# Altium schematic symbol library jlcpcb_2025_04_ferrites_extended_0603.schlib: 833 symbols (part 2 of 4) (continued)
## CBW160808U310T
designator FB?  Impedance @ Frequency: 31Ω@100MHz
Ferrite, 31Ω@100MHz, ±25%, 80mΩ, 1A, SMD 0603; Manufacturer: FH(Guangdong Fenghua Advanced Tech); Manufacturer Part Number: CBW160808U310T; Package Size: 0603; JLCPCB Basic Part: No; JLCPCB Part Number: C361672; Supplier 1: LCSC; Category: Ferrite Beads; Supplier Part Number 1: C361672; Tolerance: ±25%; Rated Current: 1A; DC Resistance: 80mΩ; RoHS: Yes; ComponentLink1Description: Datasheet; ComponentLink1URL: https://wmsc.lcsc.com/wmsc/upload/file/pdf/v2/lcsc/2304140030_FH--Guangdong-Fenghua-Advanced-Tech-CBW160808U310T_C361672.pdf; ComponentLink2Description: JLCPCB Part URL; ComponentLink2URL: https://jlcpcb.com/partdetail/C361672; ComponentLink3Description: LCSC Part URL; ComponentLink3URL: https://lcsc.com/product-detail/Ferrite-Beads_FH-Guangdong-Fenghua-Advanced-Tech-FH-Guangdong-Fenghua-Advanced-Tech-CBW160808U310T_C361672.html
footprint FB-0603 (0603 (1608M) Ferrite)
pins: 1, 2

## CBW160808U330T
designator FB?  Impedance @ Frequency: 33Ω@100MHz
Ferrite, 33Ω@100MHz, ±25%, SMD 0603; Manufacturer: FH(Guangdong Fenghua Advanced Tech); Manufacturer Part Number: CBW160808U330T; Package Size: 0603; JLCPCB Basic Part: No; JLCPCB Part Number: C139180; Supplier 1: LCSC; Category: Ferrite Beads; Supplier Part Number 1: C139180; Tolerance: ±25%; RoHS: Yes; ComponentLink1Description: Datasheet; ComponentLink1URL: https://wmsc.lcsc.com/wmsc/upload/file/pdf/v2/lcsc/2008192032_FH--Guangdong-Fenghua-Advanced-Tech-CBW160808U330T_C139180.pdf; ComponentLink2Description: JLCPCB Part URL; ComponentLink2URL: https://jlcpcb.com/partdetail/C139180; ComponentLink3Description: LCSC Part URL; ComponentLink3URL: https://lcsc.com/product-detail/Ferrite-Beads_FH-Guangdong-Fenghua-Advanced-Tech-FH-Guangdong-Fenghua-Advanced-Tech-CBW160808U330T_C139180.html
pins: 1, 2

## CBW160808U331T
designator FB?  Impedance @ Frequency: 330Ω@100MHz
Ferrite, 330Ω@100MHz, ±25%, SMD 0603; Manufacturer: FH(Guangdong Fenghua Advanced Tech); Manufacturer Part Number: CBW160808U331T; Package Size: 0603; JLCPCB Basic Part: No; JLCPCB Part Number: C139181; Supplier 1: LCSC; Category: Ferrite Beads; Supplier Part Number 1: C139181; Tolerance: ±25%; RoHS: Yes; ComponentLink1Description: Datasheet; ComponentLink1URL: https://wmsc.lcsc.com/wmsc/upload/file/pdf/v2/lcsc/2304140030_FH--Guangdong-Fenghua-Advanced-Tech-CBW160808U331T_C139181.pdf; ComponentLink2Description: JLCPCB Part URL; ComponentLink2URL: https://jlcpcb.com/partdetail/C139181; ComponentLink3Description: LCSC Part URL; ComponentLink3URL: https://lcsc.com/product-detail/Ferrite-Beads_FH-Guangdong-Fenghua-Advanced-Tech-FH-Guangdong-Fenghua-Advanced-Tech-CBW160808U331T_C139181.html
pins: 1, 2

## CBW160808U391T
designator FB?  Impedance @ Frequency: 390Ω@100MHz
Ferrite, 390Ω@100MHz, ±25%, SMD 0603; Manufacturer: FH(Guangdong Fenghua Advanced Tech); Manufacturer Part Number: CBW160808U391T; Package Size: 0603; JLCPCB Basic Part: No; JLCPCB Part Number: C394472; Supplier 1: LCSC; Category: Ferrite Beads; Supplier Part Number 1: C394472; Tolerance: ±25%; RoHS: Yes; ComponentLink1Description: Datasheet; ComponentLink1URL: https://wmsc.lcsc.com/wmsc/upload/file/pdf/v2/lcsc/1912111437_FH--Guangdong-Fenghua-Advanced-Tech-CBW160808U391T_C394472.pdf; ComponentLink2Description: JLCPCB Part URL; ComponentLink2URL: https://jlcpcb.com/partdetail/C394472; ComponentLink3Description: LCSC Part URL; ComponentLink3URL: https://lcsc.com/product-detail/Ferrite-Beads_FH-Guangdong-Fenghua-Advanced-Tech-FH-Guangdong-Fenghua-Advanced-Tech-CBW160808U391T_C394472.html
pins: 1, 2

## CBW160808U401T
designator FB?  Impedance @ Frequency: 400Ω@100MHz
Ferrite, 400Ω@100MHz, ±25%, SMD 0603; Manufacturer: FH(Guangdong Fenghua Advanced Tech); Manufacturer Part Number: CBW160808U401T; Package Size: 0603; JLCPCB Basic Part: No; JLCPCB Part Number: C394473; Supplier 1: LCSC; Category: Ferrite Beads; Supplier Part Number 1: C394473; Tolerance: ±25%; RoHS: Yes; ComponentLink1Description: Datasheet; ComponentLink1URL: https://wmsc.lcsc.com/wmsc/upload/file/pdf/v2/lcsc/1912111437_FH--Guangdong-Fenghua-Advanced-Tech-CBW160808U401T_C394473.pdf; ComponentLink2Description: JLCPCB Part URL; ComponentLink2URL: https://jlcpcb.com/partdetail/C394473; ComponentLink3Description: LCSC Part URL; ComponentLink3URL: https://lcsc.com/product-detail/Ferrite-Beads_FH-Guangdong-Fenghua-Advanced-Tech-FH-Guangdong-Fenghua-Advanced-Tech-CBW160808U401T_C394473.html
pins: 1, 2

## CBW160808U470T
designator FB?  Impedance @ Frequency: 47Ω@100MHz
Ferrite, 47Ω@100MHz, ±25%, SMD 0603; Manufacturer: FH(Guangdong Fenghua Advanced Tech); Manufacturer Part Number: CBW160808U470T; Package Size: 0603; JLCPCB Basic Part: No; JLCPCB Part Number: C394474; Supplier 1: LCSC; Category: Ferrite Beads; Supplier Part Number 1: C394474; Tolerance: ±25%; RoHS: Yes; ComponentLink1Description: Datasheet; ComponentLink1URL: https://wmsc.lcsc.com/wmsc/upload/file/pdf/v2/lcsc/1912111437_FH--Guangdong-Fenghua-Advanced-Tech-CBW160808U470T_C394474.pdf; ComponentLink2Description: JLCPCB Part URL; ComponentLink2URL: https://jlcpcb.com/partdetail/C394474; ComponentLink3Description: LCSC Part URL; ComponentLink3URL: https://lcsc.com/product-detail/Ferrite-Beads_FH-Guangdong-Fenghua-Advanced-Tech-FH-Guangdong-Fenghua-Advanced-Tech-CBW160808U470T_C394474.html
pins: 1, 2

## CBW160808U471T
designator FB?  Impedance @ Frequency: 470Ω@100MHz
Ferrite, 470Ω@100MHz, ±25%, SMD 0603; Manufacturer: FH(Guangdong Fenghua Advanced Tech); Manufacturer Part Number: CBW160808U471T; Package Size: 0603; JLCPCB Basic Part: No; JLCPCB Part Number: C394475; Supplier 1: LCSC; Category: Ferrite Beads; Supplier Part Number 1: C394475; Tolerance: ±25%; RoHS: Yes; ComponentLink1Description: Datasheet; ComponentLink1URL: https://wmsc.lcsc.com/wmsc/upload/file/pdf/v2/lcsc/1912111437_FH--Guangdong-Fenghua-Advanced-Tech-CBW160808U471T_C394475.pdf; ComponentLink2Description: JLCPCB Part URL; ComponentLink2URL: https://jlcpcb.com/partdetail/C394475; ComponentLink3Description: LCSC Part URL; ComponentLink3URL: https://lcsc.com/product-detail/Ferrite-Beads_FH-Guangdong-Fenghua-Advanced-Tech-FH-Guangdong-Fenghua-Advanced-Tech-CBW160808U471T_C394475.html
pins: 1, 2

## CBW160808U500T
designator FB?  Impedance @ Frequency: 50Ω@100MHz
Ferrite, 50Ω@100MHz, ±25%, 120mΩ, 1A, SMD 0603; Manufacturer: FH(Guangdong Fenghua Advanced Tech); Manufacturer Part Number: CBW160808U500T; Package Size: 0603; JLCPCB Basic Part: No; JLCPCB Part Number: C394476; Supplier 1: LCSC; Category: Ferrite Beads; Supplier Part Number 1: C394476; Tolerance: ±25%; Rated Current: 1A; DC Resistance: 120mΩ; RoHS: Yes; ComponentLink1Description: Datasheet; ComponentLink1URL: https://wmsc.lcsc.com/wmsc/upload/file/pdf/v2/lcsc/2304140030_FH--Guangdong-Fenghua-Advanced-Tech-CBW160808U500T_C394476.pdf; ComponentLink2Description: JLCPCB Part URL; ComponentLink2URL: https://jlcpcb.com/partdetail/C394476; ComponentLink3Description: LCSC Part URL; ComponentLink3URL: https://lcsc.com/product-detail/Ferrite-Beads_FH-Guangdong-Fenghua-Advanced-Tech-FH-Guangdong-Fenghua-Advanced-Tech-CBW160808U500T_C394476.html
footprint FB-0603 (0603 (1608M) Ferrite)
pins: 1, 2

## CBW160808U600T
designator FB?  Impedance @ Frequency: 60Ω@100MHz
Ferrite, 60Ω@100MHz, ±25%, 120mΩ, 1A, SMD 0603; Manufacturer: FH(Guangdong Fenghua Advanced Tech); Manufacturer Part Number: CBW160808U600T; Package Size: 0603; JLCPCB Basic Part: No; JLCPCB Part Number: C139182; Supplier 1: LCSC; Category: Ferrite Beads; Supplier Part Number 1: C139182; Tolerance: ±25%; Rated Current: 1A; DC Resistance: 120mΩ; RoHS: Yes; ComponentLink1Description: Datasheet; ComponentLink1URL: https://wmsc.lcsc.com/wmsc/upload/file/pdf/v2/lcsc/2304140030_FH--Guangdong-Fenghua-Advanced-Tech-CBW160808U600T_C139182.pdf; ComponentLink2Description: JLCPCB Part URL; ComponentLink2URL: https://jlcpcb.com/partdetail/C139182; ComponentLink3Description: LCSC Part URL; ComponentLink3URL: https://lcsc.com/product-detail/Ferrite-Beads_FH-Guangdong-Fenghua-Advanced-Tech-FH-Guangdong-Fenghua-Advanced-Tech-CBW160808U600T_C139182.html
footprint FB-0603 (0603 (1608M) Ferrite)
pins: 1, 2

## CBW160808U601T
designator FB?  Impedance @ Frequency: 600Ω@100MHz
Ferrite, 600Ω@100MHz, ±25%, 400mΩ, 1A, SMD 0603; Manufacturer: FH(Guangdong Fenghua Advanced Tech); Manufacturer Part Number: CBW160808U601T; Package Size: 0603; JLCPCB Basic Part: No; JLCPCB Part Number: C139183; Supplier 1: LCSC; Category: Ferrite Beads; Supplier Part Number 1: C139183; Tolerance: ±25%; Rated Current: 1A; DC Resistance: 400mΩ; RoHS: Yes; ComponentLink1Description: Datasheet; ComponentLink1URL: https://wmsc.lcsc.com/wmsc/upload/file/pdf/v2/lcsc/2304140030_FH--Guangdong-Fenghua-Advanced-Tech-CBW160808U601T_C139183.pdf; ComponentLink2Description: JLCPCB Part URL; ComponentLink2URL: https://jlcpcb.com/partdetail/C139183; ComponentLink3Description: LCSC Part URL; ComponentLink3URL: https://lcsc.com/product-detail/Ferrite-Beads_FH-Guangdong-Fenghua-Advanced-Tech-FH-Guangdong-Fenghua-Advanced-Tech-CBW160808U601T_C139183.html
footprint FB-0603 (0603 (1608M) Ferrite)
pins: 1, 2

## CBW160808U700T
designator FB?  Impedance @ Frequency: 70Ω@100MHz
Ferrite, 70Ω@100MHz, ±25%, 150mΩ, 1A, SMD 0603; Manufacturer: FH(Guangdong Fenghua Advanced Tech); Manufacturer Part Number: CBW160808U700T; Package Size: 0603; JLCPCB Basic Part: No; JLCPCB Part Number: C394477; Supplier 1: LCSC; Category: Ferrite Beads; Supplier Part Number 1: C394477; Tolerance: ±25%; Rated Current: 1A; DC Resistance: 150mΩ; RoHS: Yes; ComponentLink1Description: Datasheet; ComponentLink1URL: https://wmsc.lcsc.com/wmsc/upload/file/pdf/v2/lcsc/2304140030_FH--Guangdong-Fenghua-Advanced-Tech-CBW160808U700T_C394477.pdf; ComponentLink2Description: JLCPCB Part URL; ComponentLink2URL: https://jlcpcb.com/partdetail/C394477; ComponentLink3Description: LCSC Part URL; ComponentLink3URL: https://lcsc.com/product-detail/Ferrite-Beads_FH-Guangdong-Fenghua-Advanced-Tech-FH-Guangdong-Fenghua-Advanced-Tech-CBW160808U700T_C394477.html
footprint FB-0603 (0603 (1608M) Ferrite)
pins: 1, 2

## CBW160808U750T
designator FB?  Impedance @ Frequency: 75Ω@100MHz
Ferrite, 75Ω@100MHz, ±25%, SMD 0603; Manufacturer: FH(Guangdong Fenghua Advanced Tech); Manufacturer Part Number: CBW160808U750T; Package Size: 0603; JLCPCB Basic Part: No; JLCPCB Part Number: C394478; Supplier 1: LCSC; Category: Ferrite Beads; Supplier Part Number 1: C394478; Tolerance: ±25%; RoHS: Yes; ComponentLink1Description: Datasheet; ComponentLink1URL: https://wmsc.lcsc.com/wmsc/upload/file/pdf/v2/lcsc/1912111437_FH--Guangdong-Fenghua-Advanced-Tech-CBW160808U750T_C394478.pdf; ComponentLink2Description: JLCPCB Part URL; ComponentLink2URL: https://jlcpcb.com/partdetail/C394478; ComponentLink3Description: LCSC Part URL; ComponentLink3URL: https://lcsc.com/product-detail/Ferrite-Beads_FH-Guangdong-Fenghua-Advanced-Tech-FH-Guangdong-Fenghua-Advanced-Tech-CBW160808U750T_C394478.html
pins: 1, 2

## CBW160808U751T
designator FB?  Impedance @ Frequency: 750Ω@100MHz
Ferrite, 750Ω@100MHz, ±25%, SMD 0603; Manufacturer: FH(Guangdong Fenghua Advanced Tech); Manufacturer Part Number: CBW160808U751T; Package Size: 0603; JLCPCB Basic Part: No; JLCPCB Part Number: C394479; Supplier 1: LCSC; Category: Ferrite Beads; Supplier Part Number 1: C394479; Tolerance: ±25%; RoHS: Yes; ComponentLink1Description: Datasheet; ComponentLink1URL: https://wmsc.lcsc.com/wmsc/upload/file/pdf/v2/lcsc/1912111437_FH--Guangdong-Fenghua-Advanced-Tech-CBW160808U751T_C394479.pdf; ComponentLink2Description: JLCPCB Part URL; ComponentLink2URL: https://jlcpcb.com/partdetail/C394479; ComponentLink3Description: LCSC Part URL; ComponentLink3URL: https://lcsc.com/product-detail/Ferrite-Beads_FH-Guangdong-Fenghua-Advanced-Tech-FH-Guangdong-Fenghua-Advanced-Tech-CBW160808U751T_C394479.html
pins: 1, 2

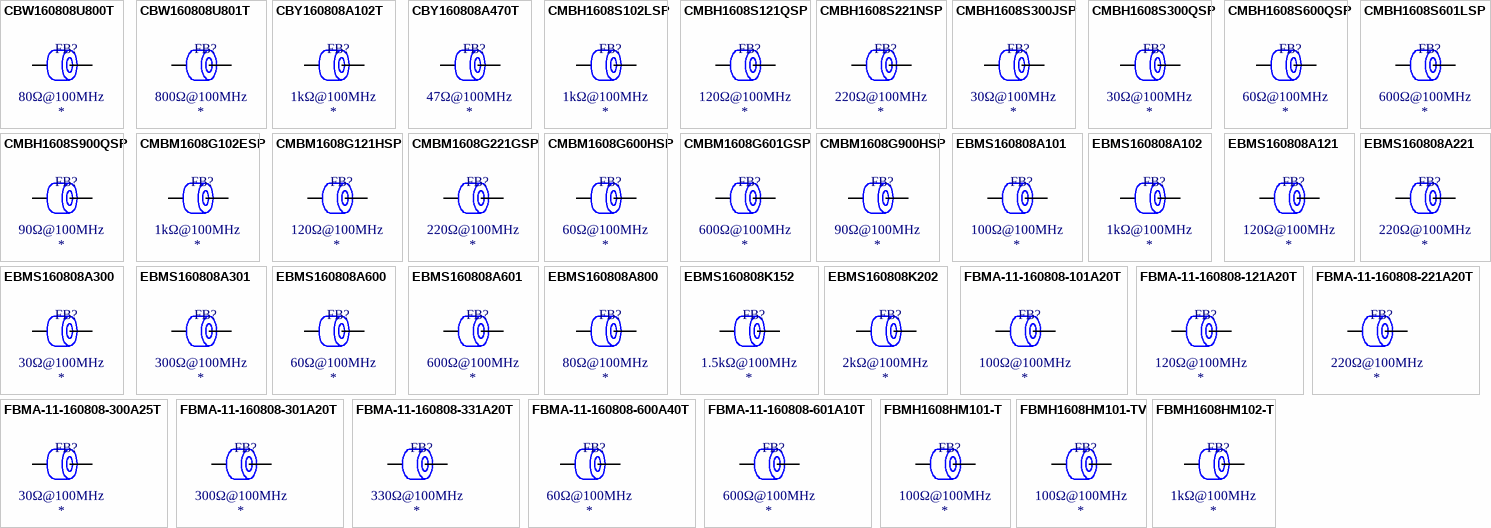
[diagram p8: symbols CBW160808U800T to FBMH1608HM102-T]

## CBW160808U800T
designator FB?  Impedance @ Frequency: 80Ω@100MHz
Ferrite, 80Ω@100MHz, ±25%, 200mΩ, 1A, SMD 0603; Manufacturer: FH(Guangdong Fenghua Advanced Tech); Manufacturer Part Number: CBW160808U800T; Package Size: 0603; JLCPCB Basic Part: No; JLCPCB Part Number: C268312; Supplier 1: LCSC; Category: Ferrite Beads; Supplier Part Number 1: C268312; Tolerance: ±25%; Rated Current: 1A; DC Resistance: 200mΩ; RoHS: Yes; ComponentLink1Description: Datasheet; ComponentLink1URL: https://wmsc.lcsc.com/wmsc/upload/file/pdf/v2/lcsc/2304140030_FH--Guangdong-Fenghua-Advanced-Tech-CBW160808U800T_C268312.pdf; ComponentLink2Description: JLCPCB Part URL; ComponentLink2URL: https://jlcpcb.com/partdetail/C268312; ComponentLink3Description: LCSC Part URL; ComponentLink3URL: https://lcsc.com/product-detail/Ferrite-Beads_FH-Guangdong-Fenghua-Advanced-Tech-FH-Guangdong-Fenghua-Advanced-Tech-CBW160808U800T_C268312.html
footprint FB-0603 (0603 (1608M) Ferrite)
pins: 1, 2

## CBW160808U801T
designator FB?  Impedance @ Frequency: 800Ω@100MHz
Ferrite, 800Ω@100MHz, ±25%, 550mΩ, 500mA, SMD 0603; Manufacturer: FH(Guangdong Fenghua Advanced Tech); Manufacturer Part Number: CBW160808U801T; Package Size: 0603; JLCPCB Basic Part: No; JLCPCB Part Number: C361676; Supplier 1: LCSC; Category: Ferrite Beads; Supplier Part Number 1: C361676; Tolerance: ±25%; Rated Current: 500mA; DC Resistance: 550mΩ; RoHS: Yes; ComponentLink1Description: Datasheet; ComponentLink1URL: https://wmsc.lcsc.com/wmsc/upload/file/pdf/v2/lcsc/1912111437_FH--Guangdong-Fenghua-Advanced-Tech-CBW160808U801T_C361676.pdf; ComponentLink2Description: JLCPCB Part URL; ComponentLink2URL: https://jlcpcb.com/partdetail/C361676; ComponentLink3Description: LCSC Part URL; ComponentLink3URL: https://lcsc.com/product-detail/Ferrite-Beads_FH-Guangdong-Fenghua-Advanced-Tech-FH-Guangdong-Fenghua-Advanced-Tech-CBW160808U801T_C361676.html
footprint FB-0603 (0603 (1608M) Ferrite)
pins: 1, 2

## CBY160808A102T
designator FB?  Impedance @ Frequency: 1kΩ@100MHz
Ferrite, 1kΩ@100MHz, ±25%, 900mΩ, 100mA, SMD 0603; Manufacturer: FH(Guangdong Fenghua Advanced Tech); Manufacturer Part Number: CBY160808A102T; Package Size: 0603; JLCPCB Basic Part: No; JLCPCB Part Number: C1322416; Supplier 1: LCSC; Category: Ferrite Beads; Supplier Part Number 1: C1322416; Tolerance: ±25%; Rated Current: 100mA; DC Resistance: 900mΩ; RoHS: Yes; ComponentLink1Description: Datasheet; ComponentLink1URL: https://wmsc.lcsc.com/wmsc/upload/file/pdf/v2/lcsc/2012181943_FH--Guangdong-Fenghua-Advanced-Tech-CBY160808A102T_C1322416.pdf; ComponentLink2Description: JLCPCB Part URL; ComponentLink2URL: https://jlcpcb.com/partdetail/C1322416; ComponentLink3Description: LCSC Part URL; ComponentLink3URL: https://lcsc.com/product-detail/Ferrite-Beads_FH-Guangdong-Fenghua-Advanced-Tech-FH-Guangdong-Fenghua-Advanced-Tech-CBY160808A102T_C1322416.html
footprint FB-0603 (0603 (1608M) Ferrite)
pins: 1, 2

## CBY160808A470T
designator FB?  Impedance @ Frequency: 47Ω@100MHz
Ferrite, 47Ω@100MHz, ±25%, SMD 0603; Manufacturer: FH(Guangdong Fenghua Advanced Tech); Manufacturer Part Number: CBY160808A470T; Package Size: 0603; JLCPCB Basic Part: No; JLCPCB Part Number: C1322417; Supplier 1: LCSC; Category: Ferrite Beads; Supplier Part Number 1: C1322417; Tolerance: ±25%; RoHS: Yes; ComponentLink1Description: Datasheet; ComponentLink1URL: https://wmsc.lcsc.com/wmsc/upload/file/pdf/v2/lcsc/2012182008_FH--Guangdong-Fenghua-Advanced-Tech-CBY160808A470T_C1322417.pdf; ComponentLink2Description: JLCPCB Part URL; ComponentLink2URL: https://jlcpcb.com/partdetail/C1322417; ComponentLink3Description: LCSC Part URL; ComponentLink3URL: https://lcsc.com/product-detail/Ferrite-Beads_FH-Guangdong-Fenghua-Advanced-Tech-FH-Guangdong-Fenghua-Advanced-Tech-CBY160808A470T_C1322417.html
pins: 1, 2

## CMBH1608S102LSP
designator FB?  Impedance @ Frequency: 1kΩ@100MHz
Ferrite, 1kΩ@100MHz, ±25%, 300mΩ, 1A, SMD 0603; Manufacturer: Cybermax; Manufacturer Part Number: CMBH1608S102LSP; Package Size: 0603; JLCPCB Basic Part: No; JLCPCB Part Number: C405004; Supplier 1: LCSC; Category: Ferrite Beads; Supplier Part Number 1: C405004; Tolerance: ±25%; Rated Current: 1A; DC Resistance: 300mΩ; RoHS: Yes; ComponentLink1Description: Datasheet; ComponentLink1URL: https://wmsc.lcsc.com/wmsc/upload/file/pdf/v2/lcsc/1912111437_Cybermax-CMBH1608S102LSP_C405004.pdf; ComponentLink2Description: JLCPCB Part URL; ComponentLink2URL: https://jlcpcb.com/partdetail/C405004; ComponentLink3Description: LCSC Part URL; ComponentLink3URL: https://lcsc.com/product-detail/Ferrite-Beads_Cybermax-Cybermax-CMBH1608S102LSP_C405004.html
footprint FB-0603 (0603 (1608M) Ferrite)
pins: 1, 2

## CMBH1608S121QSP
designator FB?  Impedance @ Frequency: 120Ω@100MHz
Ferrite, 120Ω@100MHz, ±25%, 70mΩ, 3A, SMD 0603; Manufacturer: Cybermax; Manufacturer Part Number: CMBH1608S121QSP; Package Size: 0603; JLCPCB Basic Part: No; JLCPCB Part Number: C405001; Supplier 1: LCSC; Category: Ferrite Beads; Supplier Part Number 1: C405001; Tolerance: ±25%; Rated Current: 3A; DC Resistance: 70mΩ; RoHS: Yes; ComponentLink1Description: Datasheet; ComponentLink1URL: https://wmsc.lcsc.com/wmsc/upload/file/pdf/v2/lcsc/2304140030_Cybermax-CMBH1608S121QSP_C405001.pdf; ComponentLink2Description: JLCPCB Part URL; ComponentLink2URL: https://jlcpcb.com/partdetail/C405001; ComponentLink3Description: LCSC Part URL; ComponentLink3URL: https://lcsc.com/product-detail/Ferrite-Beads_Cybermax-Cybermax-CMBH1608S121QSP_C405001.html
footprint FB-0603 (0603 (1608M) Ferrite)
pins: 1, 2

## CMBH1608S221NSP
designator FB?  Impedance @ Frequency: 220Ω@100MHz
Ferrite, 220Ω@100MHz, ±25%, 90mΩ, 2A, SMD 0603; Manufacturer: Cybermax; Manufacturer Part Number: CMBH1608S221NSP; Package Size: 0603; JLCPCB Basic Part: No; JLCPCB Part Number: C405002; Supplier 1: LCSC; Category: Ferrite Beads; Supplier Part Number 1: C405002; Tolerance: ±25%; Rated Current: 2A; DC Resistance: 90mΩ; RoHS: Yes; ComponentLink1Description: Datasheet; ComponentLink1URL: https://wmsc.lcsc.com/wmsc/upload/file/pdf/v2/lcsc/2304140030_Cybermax-CMBH1608S221NSP_C405002.pdf; ComponentLink2Description: JLCPCB Part URL; ComponentLink2URL: https://jlcpcb.com/partdetail/C405002; ComponentLink3Description: LCSC Part URL; ComponentLink3URL: https://lcsc.com/product-detail/Ferrite-Beads_Cybermax-Cybermax-CMBH1608S221NSP_C405002.html
footprint FB-0603 (0603 (1608M) Ferrite)
pins: 1, 2

## CMBH1608S300JSP
designator FB?  Impedance @ Frequency: 30Ω@100MHz
Ferrite, 30Ω@100MHz, ±25%, 800mA, SMD 0603; Manufacturer: Cybermax; Manufacturer Part Number: CMBH1608S300JSP; Package Size: 0603; JLCPCB Basic Part: No; JLCPCB Part Number: C404978; Supplier 1: LCSC; Category: Ferrite Beads; Supplier Part Number 1: C404978; Tolerance: ±25%; Rated Current: 800mA; RoHS: Yes; ComponentLink1Description: Datasheet; ComponentLink1URL: https://wmsc.lcsc.com/wmsc/upload/file/pdf/v2/lcsc/2304140030_Cybermax-CMBH1608S300JSP_C404978.pdf; ComponentLink2Description: JLCPCB Part URL; ComponentLink2URL: https://jlcpcb.com/partdetail/C404978; ComponentLink3Description: LCSC Part URL; ComponentLink3URL: https://lcsc.com/product-detail/Ferrite-Beads_Cybermax-Cybermax-CMBH1608S300JSP_C404978.html
pins: 1, 2

## CMBH1608S300QSP
designator FB?  Impedance @ Frequency: 30Ω@100MHz
Ferrite, 30Ω@100MHz, ±25%, 40mΩ, 3A, SMD 0603; Manufacturer: Cybermax; Manufacturer Part Number: CMBH1608S300QSP; Package Size: 0603; JLCPCB Basic Part: No; JLCPCB Part Number: C404998; Supplier 1: LCSC; Category: Ferrite Beads; Supplier Part Number 1: C404998; Tolerance: ±25%; Rated Current: 3A; DC Resistance: 40mΩ; RoHS: Yes; ComponentLink1Description: Datasheet; ComponentLink1URL: https://wmsc.lcsc.com/wmsc/upload/file/pdf/v2/lcsc/2304140030_Cybermax-CMBH1608S300QSP_C404998.pdf; ComponentLink2Description: JLCPCB Part URL; ComponentLink2URL: https://jlcpcb.com/partdetail/C404998; ComponentLink3Description: LCSC Part URL; ComponentLink3URL: https://lcsc.com/product-detail/Ferrite-Beads_Cybermax-Cybermax-CMBH1608S300QSP_C404998.html
footprint FB-0603 (0603 (1608M) Ferrite)
pins: 1, 2

## CMBH1608S600QSP
designator FB?  Impedance @ Frequency: 60Ω@100MHz
Ferrite, 60Ω@100MHz, ±25%, 40mΩ, 3A, SMD 0603; Manufacturer: Cybermax; Manufacturer Part Number: CMBH1608S600QSP; Package Size: 0603; JLCPCB Basic Part: No; JLCPCB Part Number: C404999; Supplier 1: LCSC; Category: Ferrite Beads; Supplier Part Number 1: C404999; Tolerance: ±25%; Rated Current: 3A; DC Resistance: 40mΩ; RoHS: Yes; ComponentLink1Description: Datasheet; ComponentLink1URL: https://wmsc.lcsc.com/wmsc/upload/file/pdf/v2/lcsc/2304140030_Cybermax-CMBH1608S600QSP_C404999.pdf; ComponentLink2Description: JLCPCB Part URL; ComponentLink2URL: https://jlcpcb.com/partdetail/C404999; ComponentLink3Description: LCSC Part URL; ComponentLink3URL: https://lcsc.com/product-detail/Ferrite-Beads_Cybermax-Cybermax-CMBH1608S600QSP_C404999.html
footprint FB-0603 (0603 (1608M) Ferrite)
pins: 1, 2

## CMBH1608S601LSP
designator FB?  Impedance @ Frequency: 600Ω@100MHz
Ferrite, 600Ω@100MHz, ±25%, 200mΩ, 1A, SMD 0603; Manufacturer: Cybermax; Manufacturer Part Number: CMBH1608S601LSP; Package Size: 0603; JLCPCB Basic Part: No; JLCPCB Part Number: C405003; Supplier 1: LCSC; Category: Ferrite Beads; Supplier Part Number 1: C405003; Tolerance: ±25%; Rated Current: 1A; DC Resistance: 200mΩ; RoHS: Yes; ComponentLink1Description: Datasheet; ComponentLink1URL: https://wmsc.lcsc.com/wmsc/upload/file/pdf/v2/lcsc/2304140030_Cybermax-CMBH1608S601LSP_C405003.pdf; ComponentLink2Description: JLCPCB Part URL; ComponentLink2URL: https://jlcpcb.com/partdetail/C405003; ComponentLink3Description: LCSC Part URL; ComponentLink3URL: https://lcsc.com/product-detail/Ferrite-Beads_Cybermax-Cybermax-CMBH1608S601LSP_C405003.html
footprint FB-0603 (0603 (1608M) Ferrite)
pins: 1, 2

## CMBH1608S900QSP
designator FB?  Impedance @ Frequency: 90Ω@100MHz
Ferrite, 90Ω@100MHz, ±25%, 40mΩ, 3A, SMD 0603; Manufacturer: Cybermax; Manufacturer Part Number: CMBH1608S900QSP; Package Size: 0603; JLCPCB Basic Part: No; JLCPCB Part Number: C405000; Supplier 1: LCSC; Category: Ferrite Beads; Supplier Part Number 1: C405000; Tolerance: ±25%; Rated Current: 3A; DC Resistance: 40mΩ; RoHS: Yes; ComponentLink1Description: Datasheet; ComponentLink1URL: https://wmsc.lcsc.com/wmsc/upload/file/pdf/v2/lcsc/2304140030_Cybermax-CMBH1608S900QSP_C405000.pdf; ComponentLink2Description: JLCPCB Part URL; ComponentLink2URL: https://jlcpcb.com/partdetail/C405000; ComponentLink3Description: LCSC Part URL; ComponentLink3URL: https://lcsc.com/product-detail/Ferrite-Beads_Cybermax-Cybermax-CMBH1608S900QSP_C405000.html
footprint FB-0603 (0603 (1608M) Ferrite)
pins: 1, 2

## CMBM1608G102ESP
designator FB?  Impedance @ Frequency: 1kΩ@100MHz
Ferrite, 1kΩ@100MHz, ±25%, 600mΩ, 300mA, SMD 0603; Manufacturer: Cybermax; Manufacturer Part Number: CMBM1608G102ESP; Package Size: 0603; JLCPCB Basic Part: No; JLCPCB Part Number: C404984; Supplier 1: LCSC; Category: Ferrite Beads; Supplier Part Number 1: C404984; Tolerance: ±25%; Rated Current: 300mA; DC Resistance: 600mΩ; RoHS: Yes; ComponentLink1Description: Datasheet; ComponentLink1URL: https://wmsc.lcsc.com/wmsc/upload/file/pdf/v2/lcsc/1912111437_Cybermax-CMBM1608G102ESP_C404984.pdf; ComponentLink2Description: JLCPCB Part URL; ComponentLink2URL: https://jlcpcb.com/partdetail/C404984; ComponentLink3Description: LCSC Part URL; ComponentLink3URL: https://lcsc.com/product-detail/Ferrite-Beads_Cybermax-Cybermax-CMBM1608G102ESP_C404984.html
footprint FB-0603 (0603 (1608M) Ferrite)
pins: 1, 2

## CMBM1608G121HSP
designator FB?  Impedance @ Frequency: 120Ω@100MHz
Ferrite, 120Ω@100MHz, ±25%, 200mΩ, 600mA, SMD 0603; Manufacturer: Cybermax; Manufacturer Part Number: CMBM1608G121HSP; Package Size: 0603; JLCPCB Basic Part: No; JLCPCB Part Number: C404981; Supplier 1: LCSC; Category: Ferrite Beads; Supplier Part Number 1: C404981; Tolerance: ±25%; Rated Current: 600mA; DC Resistance: 200mΩ; RoHS: Yes; ComponentLink1Description: Datasheet; ComponentLink1URL: https://wmsc.lcsc.com/wmsc/upload/file/pdf/v2/lcsc/2304140030_Cybermax-CMBM1608G121HSP_C404981.pdf; ComponentLink2Description: JLCPCB Part URL; ComponentLink2URL: https://jlcpcb.com/partdetail/C404981; ComponentLink3Description: LCSC Part URL; ComponentLink3URL: https://lcsc.com/product-detail/Ferrite-Beads_Cybermax-Cybermax-CMBM1608G121HSP_C404981.html
footprint FB-0603 (0603 (1608M) Ferrite)
pins: 1, 2

## CMBM1608G221GSP
designator FB?  Impedance @ Frequency: 220Ω@100MHz
Ferrite, 220Ω@100MHz, ±25%, 300mΩ, 500mA, SMD 0603; Manufacturer: Cybermax; Manufacturer Part Number: CMBM1608G221GSP; Package Size: 0603; JLCPCB Basic Part: No; JLCPCB Part Number: C404982; Supplier 1: LCSC; Category: Ferrite Beads; Supplier Part Number 1: C404982; Tolerance: ±25%; Rated Current: 500mA; DC Resistance: 300mΩ; RoHS: Yes; ComponentLink1Description: Datasheet; ComponentLink1URL: https://wmsc.lcsc.com/wmsc/upload/file/pdf/v2/lcsc/2304140030_Cybermax-CMBM1608G221GSP_C404982.pdf; ComponentLink2Description: JLCPCB Part URL; ComponentLink2URL: https://jlcpcb.com/partdetail/C404982; ComponentLink3Description: LCSC Part URL; ComponentLink3URL: https://lcsc.com/product-detail/Ferrite-Beads_Cybermax-Cybermax-CMBM1608G221GSP_C404982.html
footprint FB-0603 (0603 (1608M) Ferrite)
pins: 1, 2

## CMBM1608G600HSP
designator FB?  Impedance @ Frequency: 60Ω@100MHz
Ferrite, 60Ω@100MHz, ±25%, 100mΩ, 600mA, SMD 0603; Manufacturer: Cybermax; Manufacturer Part Number: CMBM1608G600HSP; Package Size: 0603; JLCPCB Basic Part: No; JLCPCB Part Number: C404979; Supplier 1: LCSC; Category: Ferrite Beads; Supplier Part Number 1: C404979; Tolerance: ±25%; Rated Current: 600mA; DC Resistance: 100mΩ; RoHS: Yes; ComponentLink1Description: Datasheet; ComponentLink1URL: https://wmsc.lcsc.com/wmsc/upload/file/pdf/v2/lcsc/2304140030_Cybermax-CMBM1608G600HSP_C404979.pdf; ComponentLink2Description: JLCPCB Part URL; ComponentLink2URL: https://jlcpcb.com/partdetail/C404979; ComponentLink3Description: LCSC Part URL; ComponentLink3URL: https://lcsc.com/product-detail/Ferrite-Beads_Cybermax-Cybermax-CMBM1608G600HSP_C404979.html
footprint FB-0603 (0603 (1608M) Ferrite)
pins: 1, 2

## CMBM1608G601GSP
designator FB?  Impedance @ Frequency: 600Ω@100MHz
Ferrite, 600Ω@100MHz, ±25%, 500mΩ, 500mA, SMD 0603; Manufacturer: Cybermax; Manufacturer Part Number: CMBM1608G601GSP; Package Size: 0603; JLCPCB Basic Part: No; JLCPCB Part Number: C404983; Supplier 1: LCSC; Category: Ferrite Beads; Supplier Part Number 1: C404983; Tolerance: ±25%; Rated Current: 500mA; DC Resistance: 500mΩ; RoHS: Yes; ComponentLink1Description: Datasheet; ComponentLink1URL: https://wmsc.lcsc.com/wmsc/upload/file/pdf/v2/lcsc/2304140030_Cybermax-CMBM1608G601GSP_C404983.pdf; ComponentLink2Description: JLCPCB Part URL; ComponentLink2URL: https://jlcpcb.com/partdetail/C404983; ComponentLink3Description: LCSC Part URL; ComponentLink3URL: https://lcsc.com/product-detail/Ferrite-Beads_Cybermax-Cybermax-CMBM1608G601GSP_C404983.html
footprint FB-0603 (0603 (1608M) Ferrite)
pins: 1, 2

## CMBM1608G900HSP
designator FB?  Impedance @ Frequency: 90Ω@100MHz
Ferrite, 90Ω@100MHz, ±25%, 150mΩ, 600mA, SMD 0603; Manufacturer: Cybermax; Manufacturer Part Number: CMBM1608G900HSP; Package Size: 0603; JLCPCB Basic Part: No; JLCPCB Part Number: C404980; Supplier 1: LCSC; Category: Ferrite Beads; Supplier Part Number 1: C404980; Tolerance: ±25%; Rated Current: 600mA; DC Resistance: 150mΩ; RoHS: Yes; ComponentLink1Description: Datasheet; ComponentLink1URL: https://wmsc.lcsc.com/wmsc/upload/file/pdf/v2/lcsc/2304140030_Cybermax-CMBM1608G900HSP_C404980.pdf; ComponentLink2Description: JLCPCB Part URL; ComponentLink2URL: https://jlcpcb.com/partdetail/C404980; ComponentLink3Description: LCSC Part URL; ComponentLink3URL: https://lcsc.com/product-detail/Ferrite-Beads_Cybermax-Cybermax-CMBM1608G900HSP_C404980.html
footprint FB-0603 (0603 (1608M) Ferrite)
pins: 1, 2

## EBMS160808A101
designator FB?  Impedance @ Frequency: 100Ω@100MHz
Ferrite, 100Ω@100MHz, ±25%, 250mΩ, 600mA, SMD 0603; Manufacturer: HYHONGYEX; Manufacturer Part Number: EBMS160808A101; Package Size: 0603; JLCPCB Basic Part: No; JLCPCB Part Number: C963849; Supplier 1: LCSC; Category: Ferrite Beads; Supplier Part Number 1: C963849; Tolerance: ±25%; Rated Current: 600mA; DC Resistance: 250mΩ; RoHS: Yes; ComponentLink1Description: Datasheet; ComponentLink1URL: https://wmsc.lcsc.com/wmsc/upload/file/pdf/v2/lcsc/2304140030_HYHONGYEX-EBMS160808A101_C963849.pdf; ComponentLink2Description: JLCPCB Part URL; ComponentLink2URL: https://jlcpcb.com/partdetail/C963849; ComponentLink3Description: LCSC Part URL; ComponentLink3URL: https://lcsc.com/product-detail/Ferrite-Beads_HYHONGYEX-HYHONGYEX-EBMS160808A101_C963849.html
footprint FB-0603 (0603 (1608M) Ferrite)
pins: 1, 2

## EBMS160808A102
designator FB?  Impedance @ Frequency: 1kΩ@100MHz
Ferrite, 1kΩ@100MHz, ±25%, 700mΩ, 200mA, SMD 0603; Manufacturer: HYHONGYEX; Manufacturer Part Number: EBMS160808A102; Package Size: 0603; JLCPCB Basic Part: No; JLCPCB Part Number: C963854; Supplier 1: LCSC; Category: Ferrite Beads; Supplier Part Number 1: C963854; Tolerance: ±25%; Rated Current: 200mA; DC Resistance: 700mΩ; RoHS: Yes; ComponentLink1Description: Datasheet; ComponentLink1URL: https://wmsc.lcsc.com/wmsc/upload/file/pdf/v2/lcsc/2304140030_HYHONGYEX-EBMS160808A102_C963854.pdf; ComponentLink2Description: JLCPCB Part URL; ComponentLink2URL: https://jlcpcb.com/partdetail/C963854; ComponentLink3Description: LCSC Part URL; ComponentLink3URL: https://lcsc.com/product-detail/Ferrite-Beads_HYHONGYEX-HYHONGYEX-EBMS160808A102_C963854.html
footprint FB-0603 (0603 (1608M) Ferrite)
pins: 1, 2

## EBMS160808A121
designator FB?  Impedance @ Frequency: 120Ω@100MHz
Ferrite, 120Ω@100MHz, ±25%, 250mΩ, 600mA, SMD 0603; Manufacturer: HYHONGYEX; Manufacturer Part Number: EBMS160808A121; Package Size: 0603; JLCPCB Basic Part: No; JLCPCB Part Number: C963850; Supplier 1: LCSC; Category: Ferrite Beads; Supplier Part Number 1: C963850; Tolerance: ±25%; Rated Current: 600mA; DC Resistance: 250mΩ; RoHS: Yes; ComponentLink1Description: Datasheet; ComponentLink1URL: https://wmsc.lcsc.com/wmsc/upload/file/pdf/v2/lcsc/2304140030_HYHONGYEX-EBMS160808A121_C963850.pdf; ComponentLink2Description: JLCPCB Part URL; ComponentLink2URL: https://jlcpcb.com/partdetail/C963850; ComponentLink3Description: LCSC Part URL; ComponentLink3URL: https://lcsc.com/product-detail/Ferrite-Beads_HYHONGYEX-HYHONGYEX-EBMS160808A121_C963850.html
footprint FB-0603 (0603 (1608M) Ferrite)
pins: 1, 2

## EBMS160808A221
designator FB?  Impedance @ Frequency: 220Ω@100MHz
Ferrite, 220Ω@100MHz, ±25%, 300mΩ, 550mA, SMD 0603; Manufacturer: HYHONGYEX; Manufacturer Part Number: EBMS160808A221; Package Size: 0603; JLCPCB Basic Part: No; JLCPCB Part Number: C963851; Supplier 1: LCSC; Category: Ferrite Beads; Supplier Part Number 1: C963851; Tolerance: ±25%; Rated Current: 550mA; DC Resistance: 300mΩ; RoHS: Yes; ComponentLink1Description: Datasheet; ComponentLink1URL: https://wmsc.lcsc.com/wmsc/upload/file/pdf/v2/lcsc/2304140030_HYHONGYEX-EBMS160808A221_C963851.pdf; ComponentLink2Description: JLCPCB Part URL; ComponentLink2URL: https://jlcpcb.com/partdetail/C963851; ComponentLink3Description: LCSC Part URL; ComponentLink3URL: https://lcsc.com/product-detail/Ferrite-Beads_HYHONGYEX-HYHONGYEX-EBMS160808A221_C963851.html
footprint FB-0603 (0603 (1608M) Ferrite)
pins: 1, 2

## EBMS160808A300
designator FB?  Impedance @ Frequency: 30Ω@100MHz
Ferrite, 30Ω@100MHz, ±25%, 200mΩ, 700mA, SMD 0603; Manufacturer: HYHONGYEX; Manufacturer Part Number: EBMS160808A300; Package Size: 0603; JLCPCB Basic Part: No; JLCPCB Part Number: C963845; Supplier 1: LCSC; Category: Ferrite Beads; Supplier Part Number 1: C963845; Tolerance: ±25%; Rated Current: 700mA; DC Resistance: 200mΩ; RoHS: Yes; ComponentLink1Description: Datasheet; ComponentLink1URL: https://wmsc.lcsc.com/wmsc/upload/file/pdf/v2/lcsc/2304140030_HYHONGYEX-EBMS160808A300_C963845.pdf; ComponentLink2Description: JLCPCB Part URL; ComponentLink2URL: https://jlcpcb.com/partdetail/C963845; ComponentLink3Description: LCSC Part URL; ComponentLink3URL: https://lcsc.com/product-detail/Ferrite-Beads_HYHONGYEX-HYHONGYEX-EBMS160808A300_C963845.html
footprint FB-0603 (0603 (1608M) Ferrite)
pins: 1, 2

## EBMS160808A301
designator FB?  Impedance @ Frequency: 300Ω@100MHz
Ferrite, 300Ω@100MHz, ±25%, 350mΩ, 500mA, SMD 0603; Manufacturer: HYHONGYEX; Manufacturer Part Number: EBMS160808A301; Package Size: 0603; JLCPCB Basic Part: No; JLCPCB Part Number: C963852; Supplier 1: LCSC; Category: Ferrite Beads; Supplier Part Number 1: C963852; Tolerance: ±25%; Rated Current: 500mA; DC Resistance: 350mΩ; RoHS: Yes; ComponentLink1Description: Datasheet; ComponentLink1URL: https://wmsc.lcsc.com/wmsc/upload/file/pdf/v2/lcsc/2304140030_HYHONGYEX-EBMS160808A301_C963852.pdf; ComponentLink2Description: JLCPCB Part URL; ComponentLink2URL: https://jlcpcb.com/partdetail/C963852; ComponentLink3Description: LCSC Part URL; ComponentLink3URL: https://lcsc.com/product-detail/Ferrite-Beads_HYHONGYEX-HYHONGYEX-EBMS160808A301_C963852.html
footprint FB-0603 (0603 (1608M) Ferrite)
pins: 1, 2

## EBMS160808A600
designator FB?  Impedance @ Frequency: 60Ω@100MHz
Ferrite, 60Ω@100MHz, ±25%, 200mΩ, 700mA, SMD 0603; Manufacturer: HYHONGYEX; Manufacturer Part Number: EBMS160808A600; Package Size: 0603; JLCPCB Basic Part: No; JLCPCB Part Number: C963846; Supplier 1: LCSC; Category: Ferrite Beads; Supplier Part Number 1: C963846; Tolerance: ±25%; Rated Current: 700mA; DC Resistance: 200mΩ; RoHS: Yes; ComponentLink1Description: Datasheet; ComponentLink1URL: https://wmsc.lcsc.com/wmsc/upload/file/pdf/v2/lcsc/2304140030_HYHONGYEX-EBMS160808A600_C963846.pdf; ComponentLink2Description: JLCPCB Part URL; ComponentLink2URL: https://jlcpcb.com/partdetail/C963846; ComponentLink3Description: LCSC Part URL; ComponentLink3URL: https://lcsc.com/product-detail/Ferrite-Beads_HYHONGYEX-HYHONGYEX-EBMS160808A600_C963846.html
footprint FB-0603 (0603 (1608M) Ferrite)
pins: 1, 2

## EBMS160808A601
designator FB?  Impedance @ Frequency: 600Ω@100MHz
Ferrite, 600Ω@100MHz, ±25%, 500mΩ, 350mA, SMD 0603; Manufacturer: HYHONGYEX; Manufacturer Part Number: EBMS160808A601; Package Size: 0603; JLCPCB Basic Part: No; JLCPCB Part Number: C963853; Supplier 1: LCSC; Category: Ferrite Beads; Supplier Part Number 1: C963853; Tolerance: ±25%; Rated Current: 350mA; DC Resistance: 500mΩ; RoHS: Yes; ComponentLink1Description: Datasheet; ComponentLink1URL: https://wmsc.lcsc.com/wmsc/upload/file/pdf/v2/lcsc/2304140030_HYHONGYEX-EBMS160808A601_C963853.pdf; ComponentLink2Description: JLCPCB Part URL; ComponentLink2URL: https://jlcpcb.com/partdetail/C963853; ComponentLink3Description: LCSC Part URL; ComponentLink3URL: https://lcsc.com/product-detail/Ferrite-Beads_HYHONGYEX-HYHONGYEX-EBMS160808A601_C963853.html
footprint FB-0603 (0603 (1608M) Ferrite)
pins: 1, 2

## EBMS160808A800
designator FB?  Impedance @ Frequency: 80Ω@100MHz
Ferrite, 80Ω@100MHz, ±25%, 200mΩ, 700mA, SMD 0603; Manufacturer: HYHONGYEX; Manufacturer Part Number: EBMS160808A800; Package Size: 0603; JLCPCB Basic Part: No; JLCPCB Part Number: C963848; Supplier 1: LCSC; Category: Ferrite Beads; Supplier Part Number 1: C963848; Tolerance: ±25%; Rated Current: 700mA; DC Resistance: 200mΩ; RoHS: Yes; ComponentLink1Description: Datasheet; ComponentLink1URL: https://wmsc.lcsc.com/wmsc/upload/file/pdf/v2/lcsc/2304140030_HYHONGYEX-EBMS160808A800_C963848.pdf; ComponentLink2Description: JLCPCB Part URL; ComponentLink2URL: https://jlcpcb.com/partdetail/C963848; ComponentLink3Description: LCSC Part URL; ComponentLink3URL: https://lcsc.com/product-detail/Ferrite-Beads_HYHONGYEX-HYHONGYEX-EBMS160808A800_C963848.html
footprint FB-0603 (0603 (1608M) Ferrite)
pins: 1, 2

## EBMS160808K152
designator FB?  Impedance @ Frequency: 1.5kΩ@100MHz
Ferrite, 1.5kΩ@100MHz, ±25%, 1Ω, 200mA, SMD 0603; Manufacturer: HYHONGYEX; Manufacturer Part Number: EBMS160808K152; Package Size: 0603; JLCPCB Basic Part: No; JLCPCB Part Number: C963855; Supplier 1: LCSC; Category: Ferrite Beads; Supplier Part Number 1: C963855; Tolerance: ±25%; Rated Current: 200mA; DC Resistance: 1Ω; RoHS: Yes; ComponentLink1Description: Datasheet; ComponentLink1URL: https://wmsc.lcsc.com/wmsc/upload/file/pdf/v2/lcsc/2304140030_HYHONGYEX-EBMS160808K152_C963855.pdf; ComponentLink2Description: JLCPCB Part URL; ComponentLink2URL: https://jlcpcb.com/partdetail/C963855; ComponentLink3Description: LCSC Part URL; ComponentLink3URL: https://lcsc.com/product-detail/Ferrite-Beads_HYHONGYEX-HYHONGYEX-EBMS160808K152_C963855.html
footprint FB-0603 (0603 (1608M) Ferrite)
pins: 1, 2

## EBMS160808K202
designator FB?  Impedance @ Frequency: 2kΩ@100MHz
Ferrite, 2kΩ@100MHz, ±25%, 1.2Ω, 150mA, SMD 0603; Manufacturer: HYHONGYEX; Manufacturer Part Number: EBMS160808K202; Package Size: 0603; JLCPCB Basic Part: No; JLCPCB Part Number: C963856; Supplier 1: LCSC; Category: Ferrite Beads; Supplier Part Number 1: C963856; Tolerance: ±25%; Rated Current: 150mA; DC Resistance: 1.2Ω; RoHS: Yes; ComponentLink1Description: Datasheet; ComponentLink1URL: https://wmsc.lcsc.com/wmsc/upload/file/pdf/v2/lcsc/2012171840_HYHONGYEX-EBMS160808K202_C963856.pdf; ComponentLink2Description: JLCPCB Part URL; ComponentLink2URL: https://jlcpcb.com/partdetail/C963856; ComponentLink3Description: LCSC Part URL; ComponentLink3URL: https://lcsc.com/product-detail/Ferrite-Beads_HYHONGYEX-HYHONGYEX-EBMS160808K202_C963856.html
footprint FB-0603 (0603 (1608M) Ferrite)
pins: 1, 2

## FBMA-11-160808-101A20T
designator FB?  Impedance @ Frequency: 100Ω@100MHz
Ferrite, 100Ω@100MHz, ±25%, 100mΩ, 2A, SMD 0603; Manufacturer: Kingcore; Manufacturer Part Number: FBMA-11-160808-101A20T; Package Size: 0603; JLCPCB Basic Part: No; JLCPCB Part Number: C491555; Supplier 1: LCSC; Category: Ferrite Beads; Supplier Part Number 1: C491555; Tolerance: ±25%; Rated Current: 2A; DC Resistance: 100mΩ; RoHS: Yes; ComponentLink1Description: Datasheet; ComponentLink1URL: https://datasheet.lcsc.com/lcsc/2003182011_Kingcore-FBMA-11-160808-101A20T_C491555.pdf; ComponentLink2Description: JLCPCB Part URL; ComponentLink2URL: https://jlcpcb.com/partdetail/C491555; ComponentLink3Description: LCSC Part URL; ComponentLink3URL: https://lcsc.com/product-detail/Ferrite-Beads_Kingcore-Kingcore-FBMA-11-160808-101A20T_C491555.html
footprint FB-0603 (0603 (1608M) Ferrite)
pins: 1, 2

## FBMA-11-160808-121A20T
designator FB?  Impedance @ Frequency: 120Ω@100MHz
Ferrite, 120Ω@100MHz, ±25%, 100mΩ, 2A, SMD 0603; Manufacturer: Kingcore; Manufacturer Part Number: FBMA-11-160808-121A20T; Package Size: 0603; JLCPCB Basic Part: No; JLCPCB Part Number: C491556; Supplier 1: LCSC; Category: Ferrite Beads; Supplier Part Number 1: C491556; Tolerance: ±25%; Rated Current: 2A; DC Resistance: 100mΩ; RoHS: Yes; ComponentLink1Description: Datasheet; ComponentLink1URL: https://datasheet.lcsc.com/lcsc/2003182011_Kingcore-FBMA-11-160808-121A20T_C491556.pdf; ComponentLink2Description: JLCPCB Part URL; ComponentLink2URL: https://jlcpcb.com/partdetail/C491556; ComponentLink3Description: LCSC Part URL; ComponentLink3URL: https://lcsc.com/product-detail/Ferrite-Beads_Kingcore-Kingcore-FBMA-11-160808-121A20T_C491556.html
footprint FB-0603 (0603 (1608M) Ferrite)
pins: 1, 2

## FBMA-11-160808-221A20T
designator FB?  Impedance @ Frequency: 220Ω@100MHz
Ferrite, 220Ω@100MHz, ±25%, 100mΩ, 2A, SMD 0603; Manufacturer: Kingcore; Manufacturer Part Number: FBMA-11-160808-221A20T; Package Size: 0603; JLCPCB Basic Part: No; JLCPCB Part Number: C491561; Supplier 1: LCSC; Category: Ferrite Beads; Supplier Part Number 1: C491561; Tolerance: ±25%; Rated Current: 2A; DC Resistance: 100mΩ; RoHS: Yes; ComponentLink1Description: Datasheet; ComponentLink1URL: https://datasheet.lcsc.com/lcsc/2003182011_Kingcore-FBMA-11-160808-221A20T_C491561.pdf; ComponentLink2Description: JLCPCB Part URL; ComponentLink2URL: https://jlcpcb.com/partdetail/C491561; ComponentLink3Description: LCSC Part URL; ComponentLink3URL: https://lcsc.com/product-detail/Ferrite-Beads_Kingcore-Kingcore-FBMA-11-160808-221A20T_C491561.html
footprint FB-0603 (0603 (1608M) Ferrite)
pins: 1, 2

## FBMA-11-160808-300A25T
designator FB?  Impedance @ Frequency: 30Ω@100MHz
Ferrite, 30Ω@100MHz, ±25%, 50mΩ, 2.5A, SMD 0603; Manufacturer: Kingcore; Manufacturer Part Number: FBMA-11-160808-300A25T; Package Size: 0603; JLCPCB Basic Part: No; JLCPCB Part Number: C491547; Supplier 1: LCSC; Category: Ferrite Beads; Supplier Part Number 1: C491547; Tolerance: ±25%; Rated Current: 2.5A; DC Resistance: 50mΩ; RoHS: Yes; ComponentLink1Description: Datasheet; ComponentLink1URL: https://datasheet.lcsc.com/lcsc/2003182011_Kingcore-FBMA-11-160808-300A25T_C491547.pdf; ComponentLink2Description: JLCPCB Part URL; ComponentLink2URL: https://jlcpcb.com/partdetail/C491547; ComponentLink3Description: LCSC Part URL; ComponentLink3URL: https://lcsc.com/product-detail/Ferrite-Beads_Kingcore-Kingcore-FBMA-11-160808-300A25T_C491547.html
footprint FB-0603 (0603 (1608M) Ferrite)
pins: 1, 2

## FBMA-11-160808-301A20T
designator FB?  Impedance @ Frequency: 300Ω@100MHz
Ferrite, 300Ω@100MHz, ±25%, 100mΩ, 2A, SMD 0603; Manufacturer: Kingcore; Manufacturer Part Number: FBMA-11-160808-301A20T; Package Size: 0603; JLCPCB Basic Part: No; JLCPCB Part Number: C491562; Supplier 1: LCSC; Category: Ferrite Beads; Supplier Part Number 1: C491562; Tolerance: ±25%; Rated Current: 2A; DC Resistance: 100mΩ; RoHS: Yes; ComponentLink1Description: Datasheet; ComponentLink1URL: https://datasheet.lcsc.com/lcsc/2003182011_Kingcore-FBMA-11-160808-301A20T_C491562.pdf; ComponentLink2Description: JLCPCB Part URL; ComponentLink2URL: https://jlcpcb.com/partdetail/C491562; ComponentLink3Description: LCSC Part URL; ComponentLink3URL: https://lcsc.com/product-detail/Ferrite-Beads_Kingcore-Kingcore-FBMA-11-160808-301A20T_C491562.html
footprint FB-0603 (0603 (1608M) Ferrite)
pins: 1, 2

## FBMA-11-160808-331A20T
designator FB?  Impedance @ Frequency: 330Ω@100MHz
Ferrite, 330Ω@100MHz, ±25%, 100mΩ, 2A, SMD 0603; Manufacturer: Kingcore; Manufacturer Part Number: FBMA-11-160808-331A20T; Package Size: 0603; JLCPCB Basic Part: No; JLCPCB Part Number: C491563; Supplier 1: LCSC; Category: Ferrite Beads; Supplier Part Number 1: C491563; Tolerance: ±25%; Rated Current: 2A; DC Resistance: 100mΩ; RoHS: Yes; ComponentLink1Description: Datasheet; ComponentLink1URL: https://datasheet.lcsc.com/lcsc/2003182011_Kingcore-FBMA-11-160808-331A20T_C491563.pdf; ComponentLink2Description: JLCPCB Part URL; ComponentLink2URL: https://jlcpcb.com/partdetail/C491563; ComponentLink3Description: LCSC Part URL; ComponentLink3URL: https://lcsc.com/product-detail/Ferrite-Beads_Kingcore-Kingcore-FBMA-11-160808-331A20T_C491563.html
footprint FB-0603 (0603 (1608M) Ferrite)
pins: 1, 2

## FBMA-11-160808-600A40T
designator FB?  Impedance @ Frequency: 60Ω@100MHz
Ferrite, 60Ω@100MHz, ±25%, 35mΩ, 4A, SMD 0603; Manufacturer: Kingcore; Manufacturer Part Number: FBMA-11-160808-600A40T; Package Size: 0603; JLCPCB Basic Part: No; JLCPCB Part Number: C491553; Supplier 1: LCSC; Category: Ferrite Beads; Supplier Part Number 1: C491553; Tolerance: ±25%; Rated Current: 4A; DC Resistance: 35mΩ; RoHS: Yes; ComponentLink1Description: Datasheet; ComponentLink1URL: https://datasheet.lcsc.com/lcsc/2003182011_Kingcore-FBMA-11-160808-600A40T_C491553.pdf; ComponentLink2Description: JLCPCB Part URL; ComponentLink2URL: https://jlcpcb.com/partdetail/C491553; ComponentLink3Description: LCSC Part URL; ComponentLink3URL: https://lcsc.com/product-detail/Ferrite-Beads_Kingcore-Kingcore-FBMA-11-160808-600A40T_C491553.html
footprint FB-0603 (0603 (1608M) Ferrite)
pins: 1, 2

## FBMA-11-160808-601A10T
designator FB?  Impedance @ Frequency: 600Ω@100MHz
Ferrite, 600Ω@100MHz, ±25%, 200mΩ, 1A, SMD 0603; Manufacturer: Kingcore; Manufacturer Part Number: FBMA-11-160808-601A10T; Package Size: 0603; JLCPCB Basic Part: No; JLCPCB Part Number: C491565; Supplier 1: LCSC; Category: Ferrite Beads; Supplier Part Number 1: C491565; Tolerance: ±25%; Rated Current: 1A; DC Resistance: 200mΩ; RoHS: Yes; ComponentLink1Description: Datasheet; ComponentLink1URL: https://datasheet.lcsc.com/lcsc/2003182011_Kingcore-FBMA-11-160808-601A10T_C491565.pdf; ComponentLink2Description: JLCPCB Part URL; ComponentLink2URL: https://jlcpcb.com/partdetail/C491565; ComponentLink3Description: LCSC Part URL; ComponentLink3URL: https://lcsc.com/product-detail/Ferrite-Beads_Kingcore-Kingcore-FBMA-11-160808-601A10T_C491565.html
footprint FB-0603 (0603 (1608M) Ferrite)
pins: 1, 2

## FBMH1608HM101-T
designator FB?  Impedance @ Frequency: 100Ω@100MHz
Ferrite, 100Ω@100MHz, ±25%, 35mΩ, 2.5A, SMD 0603; Manufacturer: Taiyo Yuden; Manufacturer Part Number: FBMH1608HM101-T; Package Size: 0603; JLCPCB Basic Part: No; JLCPCB Part Number: C515366; Supplier 1: LCSC; Category: Ferrite Beads; Supplier Part Number 1: C515366; Tolerance: ±25%; Rated Current: 2.5A; DC Resistance: 35mΩ; RoHS: Yes; ComponentLink1Description: Datasheet; ComponentLink1URL: https://wmsc.lcsc.com/wmsc/upload/file/pdf/v2/lcsc/2008042203_Taiyo-Yuden-FBMH1608HM101-T_C515366.pdf; ComponentLink2Description: JLCPCB Part URL; ComponentLink2URL: https://jlcpcb.com/partdetail/C515366; ComponentLink3Description: LCSC Part URL; ComponentLink3URL: https://lcsc.com/product-detail/Ferrite-Beads_Taiyo-Yuden-Taiyo-Yuden-FBMH1608HM101-T_C515366.html
footprint FB-0603 (0603 (1608M) Ferrite)
pins: 1, 2

## FBMH1608HM101-TV
designator FB?  Impedance @ Frequency: 100Ω@100MHz
Ferrite, 100Ω@100MHz, ±25%, 35mΩ, 2.5A, SMD 0603; Manufacturer: Taiyo Yuden; Manufacturer Part Number: FBMH1608HM101-TV; Package Size: 0603; JLCPCB Basic Part: No; JLCPCB Part Number: C2661871; Supplier 1: LCSC; Category: Ferrite Beads; Supplier Part Number 1: C2661871; Tolerance: ±25%; Rated Current: 2.5A; DC Resistance: 35mΩ; RoHS: Yes; ComponentLink1Description: Datasheet; ComponentLink1URL: https://wmsc.lcsc.com/wmsc/upload/file/pdf/v2/lcsc/2309051427_Taiyo-Yuden-FBMH1608HM101-TV_C2661871.pdf; ComponentLink2Description: JLCPCB Part URL; ComponentLink2URL: https://jlcpcb.com/partdetail/C2661871; ComponentLink3Description: LCSC Part URL; ComponentLink3URL: https://lcsc.com/product-detail/Ferrite-Beads_Taiyo-Yuden-Taiyo-Yuden-FBMH1608HM101-TV_C2661871.html
footprint FB-0603 (0603 (1608M) Ferrite)
pins: 1, 2

## FBMH1608HM102-T
designator FB?  Impedance @ Frequency: 1kΩ@100MHz
Ferrite, 1kΩ@100MHz, ±25%, 350mΩ, 600mA, SMD 0603; Manufacturer: Taiyo Yuden; Manufacturer Part Number: FBMH1608HM102-T; Package Size: 0603; JLCPCB Basic Part: No; JLCPCB Part Number: C2766070; Supplier 1: LCSC; Category: Ferrite Beads; Supplier Part Number 1: C2766070; Tolerance: ±25%; Rated Current: 600mA; DC Resistance: 350mΩ; RoHS: Yes; ComponentLink1Description: Datasheet; ComponentLink1URL: https://wmsc.lcsc.com/wmsc/upload/file/pdf/v2/lcsc/2106061634_Taiyo-Yuden-FBMH1608HM102-T_C2766070.pdf; ComponentLink2Description: JLCPCB Part URL; ComponentLink2URL: https://jlcpcb.com/partdetail/C2766070; ComponentLink3Description: LCSC Part URL; ComponentLink3URL: https://lcsc.com/product-detail/Ferrite-Beads_Taiyo-Yuden-Taiyo-Yuden-FBMH1608HM102-T_C2766070.html
footprint FB-0603 (0603 (1608M) Ferrite)
pins: 1, 2
